# Altium footprint library Kapitoshka.PcbLib: 146 footprints (part 5 of 10)
Each footprint in its own frame and in the unit in brackets; x right, y up, seen from the top. Pads: shape width x height; smd on the part's side, far side on the other; paste and mask are expansions set on the pad; w line width, h text height; cw(c..) or ccw(c..) is an arc to the next point about the centre after c.
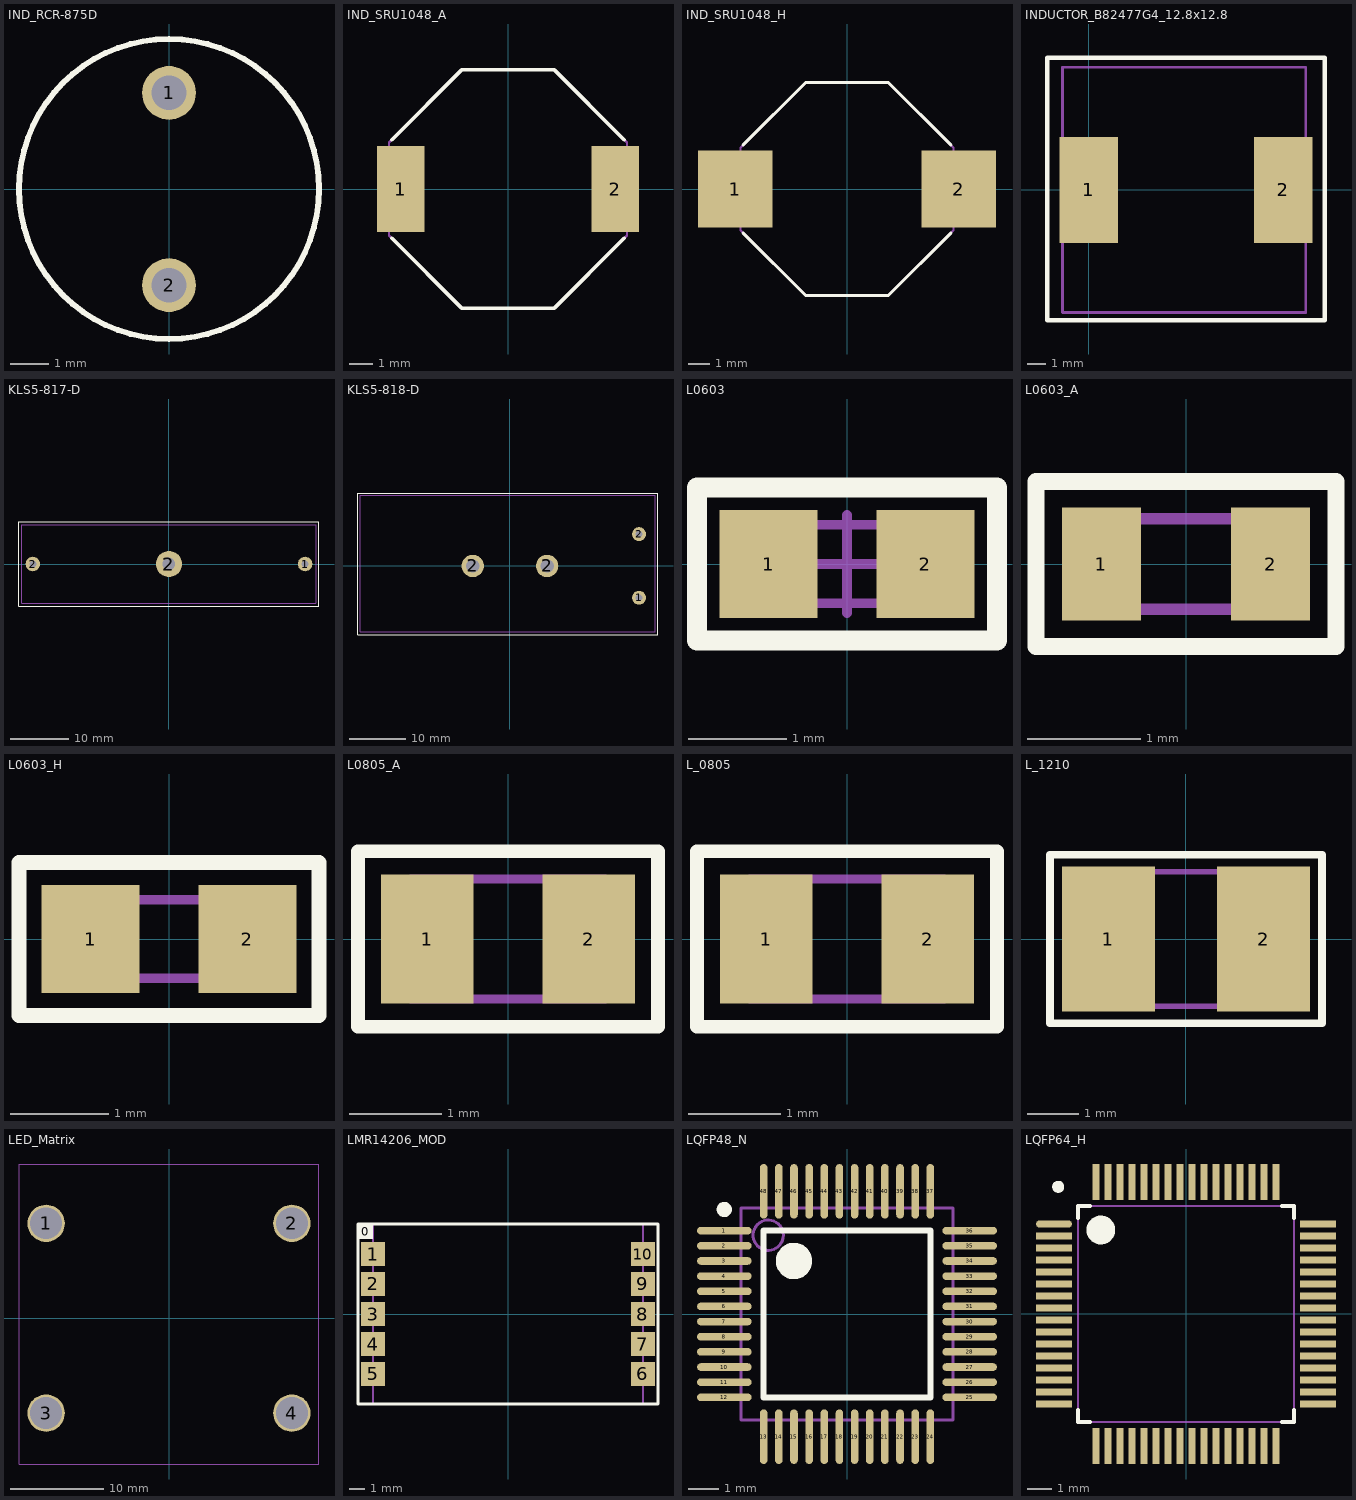
[diagram p4: the footprints below, top view; thin cyan lines are the x and y axes]

## IND_RCR-875D [mm]
height 7.5
pads (2):
  round 1.4 hole 0.9: 1(0,2.5) 2(0,-2.5)
Top Overlay:
  circle w0.15: c0,0 r3.9
Mechanical 7:
  circle w0.1: c0,0 r3.9
Mechanical 10:
  text ".Comment" at -1.245,4.335 h0.6
  text ".Designator" at -1.255,4.905 h0.8
3D body: height 7.5, standoff 0, extent -3.869,-3.892 3.9,3.892

## IND_SRU1048_A [mm]
height 5.1
pads (2):
  rect 2x3.6 smd: 1(-4.5,0) 2(4.5,0)
Top Overlay:
  lines w0.15: -4.875,-2.075 -1.95,-5 1.95,-5 4.875,-2.075 ; -4.875,2.075 -1.95,5 1.95,5 4.875,2.075
Mechanical 7:
  lines w0.1: -5,-1.95 -5,1.95 -1.95,5 1.95,5 5,1.95 5,-1.95 1.95,-5 -1.95,-5 -5,-1.95
Mechanical 10:
  text ".Comment" at -1.235,5.625 h0.6
  text ".Designator" at -1.235,6.315 h0.8
3D body: height 5.1, standoff 0, extent -5,-5 5,5

## IND_SRU1048_H [mm]
height 5.1
pads (2):
  rect 3.5x3.6 smd: 1(-5.25,0) 2(5.25,0)
Top Overlay:
  lines w0.15: -4.875,-2.075 -1.95,-5 1.95,-5 4.875,-2.075 ; -4.875,2.075 -1.95,5 1.95,5 4.875,2.075
Mechanical 7:
  lines w0.1: -5,-1.95 -5,1.95 -1.95,5 1.95,5 5,1.95 5,-1.95 1.95,-5 -1.95,-5 -5,-1.95
Mechanical 10:
  text ".Comment" at -1.235,5.625 h0.6
  text ".Designator" at -1.235,6.315 h0.8
3D body: height 5.1, standoff 0, extent -5,-5 5,5

## INDUCTOR_B82477G4_12.8x12.8 [mm] "Катушка индуктивности SMD"
pads (2):
  rect 3.1x5.6 smd: 1(0,0) 2(10.3,0)
Top Overlay:
  lines w0.25: -2.2,-6.9 -2.2,7 12.5,7 12.5,-6.9 -2.2,-6.9
Mechanical 7:
  lines w0.15: -1.4,-6.5 11.5,-6.5 11.5,6.5 -1.4,6.5 -1.4,-6.5
3D body "User Library-b82477g4.step": height 8, standoff 0, extent -1.3,-6.4 11.5,6.4

## KLS5-817-D [mm]
pads (3):
  round 2.5 hole 1.2: 1(23.405,0) 2(-23.405,0)
  round 4.5 hole 2.15: 2(0,0)
Top Overlay:
  lines w0.15: -25.775,-7.25 -25.775,7.25 25.8,7.25 25.8,-7.25 -25.775,-7.25
Mechanical 7:
  lines w0.1: 25.275,-6.75 -25.3,-6.75 -25.3,6.75 25.275,6.75 ; 25.3,-6.75 25.3,6.75
3D body "Assemblage1.STEP": height 10.86, standoff -0.14, extent -27.374,-6.25 27.374,6.25

## KLS5-818-D [mm]
pads (4):
  round 2.5 hole 1.25: 1(23.11,-5.69) 2(23.11,5.69)
  round 4 hole 2.4: 2(-6.65,0) 2(6.65,0)
Top Overlay:
  lines w0.15: -27.2,-12.3 -27.2,13 26.5,13 26.5,-12.3 -27.2,-12.3
Mechanical 7:
  lines w0.1: -26.8,-11.8 26,-11.8 26,12.7 -26.8,12.7 -26.8,-11.8
3D body "User Library-koszyk 2xAAA_214.STEP": height 13.03, standoff 0.03, extent -26.795,-11.811 26.008,12.689

## L0603 [mm]
height 0.8
pads (2):
  rect 1x1.1 smd: 1(-0.8,0) 2(0.8,0)
Top Overlay:
  lines w0.2: -1.53,-0.78 1.53,-0.78 1.53,0.78 -1.53,0.78 -1.53,-0.78
Mechanical 9:
  text ".Comment" at -1,-0.5 h0.8
  text ".Designator" at -1,0.25 h1
Mechanical 11:
  lines w0.1: -0.8,-0.4 0.8,-0.4 0.8,0.4 -0.8,0.4 -0.8,-0.4
Mechanical 15:
  lines w0.05: -1.53,-0.78 -1.53,0.78 1.53,0.78 1.53,-0.78 -1.53,-0.78
  lines w0.1: -0.5,0 0.5,0 ; 0,-0.5 0,0.5
3D body: height 0.8, standoff 0, extent -0.8,-0.4 0.8,0.4

## L0603_A [mm]
height 0.8
pads (2):
  rect 0.7x1 smd: 1(-0.75,0) 2(0.75,0)
Top Overlay:
  lines w0.15: -1.33,-0.73 1.33,-0.73 1.33,0.73 -1.33,0.73 -1.33,-0.73
Mechanical 7:
  lines w0.1: -0.8,-0.4 -0.8,0.4 0.8,0.4 0.8,-0.4 -0.8,-0.4
Mechanical 10:
  text ".Designator" at -0.62,1 h0.8
  text ".Comment" at -0.75,-1.28 h0.6
3D body: height 0.8, standoff 0, extent -0.8,-0.4 0.8,0.4

## L0603_H [mm]
height 0.8
pads (2):
  rect 1x1.1 smd: 1(-0.8,0) 2(0.8,0)
Top Overlay:
  lines w0.15: -1.53,-0.78 1.53,-0.78 1.53,0.78 -1.53,0.78 -1.53,-0.78
Mechanical 7:
  lines w0.1: -0.8,-0.4 -0.8,0.4 0.8,0.4 0.8,-0.4 -0.8,-0.4
Mechanical 10:
  text ".Comment" at -0.61,-1.33 h0.6
  text ".Designator" at -0.62,1 h0.8
3D body: height 0.8, standoff 0, extent -0.8,-0.4 0.8,0.4

## L0805_A [mm]
height 1.4
pads (2):
  rect 1x1.4 smd: 1(-0.875,0) 2(0.875,0)
Top Overlay:
  lines w0.15: -1.625,-0.95 1.625,-0.95 1.625,0.95 -1.625,0.95 -1.625,-0.95
Mechanical 7:
  lines w0.1: -1.05,-0.65 1.05,-0.65 1.05,0.65 -1.05,0.65 -1.05,-0.65
Mechanical 10:
  text ".Comment" at -1.125,-1.625 h0.6
  text ".Designator" at -1.525,1.375 h0.8
3D body: height 1.4, standoff 0, extent -1.05,-0.65 1.05,0.65

## L_0805 [mm] "SMD LED LAMP"
height 1.4
pads (2):
  rect 1x1.4 smd: 1(-0.875,0) 2(0.875,0)
Top Overlay:
  lines w0.15: -1.625,-0.95 1.625,-0.95 1.625,0.95 -1.625,0.95 -1.625,-0.95
Mechanical 7:
  lines w0.1: -1.05,-0.65 1.05,-0.65 1.05,0.65 -1.05,0.65 -1.05,-0.65
Mechanical 10:
  text ".Comment" at -1.125,-1.625 h0.6
  text ".Designator" at -1.525,1.375 h0.8
3D body "Led_Red_0805.STEP": height 1.1, standoff 0, extent -1.01,-0.625 1.01,0.625

## L_1210 [mm]
height 0.55
pads (2):
  rect 1.8x2.8 smd: 1(-1.5,0) 2(1.5,0)
Top Overlay:
  lines w0.15: -2.63,-1.63 -2.63,1.63 2.63,1.63 2.63,-1.63 -2.63,-1.63
Mechanical 7:
  lines w0.1: -1.6,-1.3 -1.6,1.3 1.6,1.3 1.6,-1.3 -1.6,-1.3
Mechanical 10:
  text ".Comment" at -0.81,-2.25 h0.6
  text ".Designator" at -0.71,1.89 h0.8
3D body: height 0.55, standoff 0, extent -1.55,-1.3 1.55,1.3

## LED_Matrix [mm] "Светодиодная матрица 8х8 32х32"
pads (4):
  round 4 hole 3.4: 1(-13.15,10.15) 2(13.15,10.15) 3(-13.15,-10.15) 4(13.15,-10.15)
Mechanical 11:
  lines w0.1: -16,-15.6 -16,16.5 16,16.5 16,-15.6 -16,-15.6
3D body "dotmatrixModule.STEP": height 23.7, standoff -5, extent -16.05,-15.6 16.05,16.5

## LMR14206_MOD [mm]
height 5
pads (11):
  rect 1x1 on Top Overlay: 0(-9.5,5.5)
  rect 1.6x1.6 smd: 1(-9,4) 2(-9,2) 3(-9,0) 4(-9,-2) 5(-9,-4) 6(9,-4) 7(9,-2) 8(9,0) 9(9,2) 10(9,4)
Top Overlay:
  lines w0.2: -10,-6 -10,6 10,6 10,-6 -10,-6
Mechanical 9:
  text ".Designator" at -2.05,1.5 h0.8
  text ".Comment" at -2.35,2.3 h0.8
Mechanical 11:
  lines w0.15: -9,-6 9,-6 9,6 -9,6 -9,-6
3D body "KPTV.E11.013.98.00.step": height 3.5, standoff 0.09, extent -9,-6 9,6

## LQFP48_N [mm] "Thin QFP, 48-Leads, Body 7x7mm, Pitch 0.5mm, IPC Medium Density"
height 1.6
pads (48):
  oval 1.8x0.25 smd: 1(-4.05,2.75) 2(-4.05,2.25) 3(-4.05,1.75) 4(-4.05,1.25) 5(-4.05,0.75) 6(-4.05,0.25) 7(-4.05,-0.25) 8(-4.05,-0.75) 9(-4.05,-1.25) 10(-4.05,-1.75) 11(-4.05,-2.25) 12(-4.05,-2.75) 25(4.05,-2.75) 26(4.05,-2.25) 27(4.05,-1.75) 28(4.05,-1.25) 29(4.05,-0.75) 30(4.05,-0.25) 31(4.05,0.25) 32(4.05,0.75) 33(4.05,1.25) 34(4.05,1.75) 35(4.05,2.25) 36(4.05,2.75)
  oval 0.25x1.8 smd: 13(-2.75,-4.05) 14(-2.25,-4.05) 15(-1.75,-4.05) 16(-1.25,-4.05) 17(-0.75,-4.05) 18(-0.25,-4.05) 19(0.25,-4.05) 20(0.75,-4.05) 21(1.25,-4.05) 22(1.75,-4.05) 23(2.25,-4.05) 24(2.75,-4.05) 37(2.75,4.05) 38(2.25,4.05) 39(1.75,4.05) 40(1.25,4.05) 41(0.75,4.05) 42(0.25,4.05) 43(-0.25,4.05) 44(-0.75,4.05) 45(-1.25,4.05) 46(-1.75,4.05) 47(-2.25,4.05) 48(-2.75,4.05)
Top Overlay:
  circle w0.6: c-1.75,1.75 r0.3
  circle w0.25: c-4.05,3.45 r0.125
  lines w0.2: -2.75,-2.75 2.75,-2.75 2.75,2.75 -2.75,2.75 -2.75,-2.75
Mechanical 7:
  circle w0.1: c-2.6,2.6 r0.5
  lines w0.1: -3.5,-3.5 3.5,-3.5 3.5,3.5 -3.5,3.5 -3.5,-3.5
Mechanical 10:
  text ".Designator" at 1.9,5.4 h0.8
  text ".Comment" at -3.7,-5.6 h0.6
3D body "vbh48a.stp": height 1.46, standoff -0.04, extent -4.507,-4.507 4.508,4.508

## LQFP64_H [mm] "64-Pin Low Profile Quad Pack 0.5 mm Pitch, IPC High Density"
height 1.6
pads (64):
  oval 1.5x0.3 smd mask+0.05: 1(-5.5,3.75)
  rect 1.5x0.3 smd mask+0.05: 2(-5.5,3.25) 3(-5.5,2.75) 4(-5.5,2.25) 5(-5.5,1.75) 6(-5.5,1.25) 7(-5.5,0.75) 8(-5.5,0.25) 9(-5.5,-0.25) 10(-5.5,-0.75) 11(-5.5,-1.25) 12(-5.5,-1.75) 13(-5.5,-2.25) 14(-5.5,-2.75) 15(-5.5,-3.25) 16(-5.5,-3.75) 33(5.5,-3.75) 34(5.5,-3.25) 35(5.5,-2.75) 36(5.5,-2.25) 37(5.5,-1.75) 38(5.5,-1.25) 39(5.5,-0.75) 40(5.5,-0.25) 41(5.5,0.25) 42(5.5,0.75) 43(5.5,1.25) 44(5.5,1.75) 45(5.5,2.25) 46(5.5,2.75) 47(5.5,3.25) 48(5.5,3.75)
  rect 0.3x1.5 smd mask+0.05: 17(-3.75,-5.5) 18(-3.25,-5.5) 19(-2.75,-5.5) 20(-2.25,-5.5) 21(-1.75,-5.5) 22(-1.25,-5.5) 23(-0.75,-5.5) 24(-0.25,-5.5) 25(0.25,-5.5) 26(0.75,-5.5) 27(1.25,-5.5) 28(1.75,-5.5) 29(2.25,-5.5) 30(2.75,-5.5) 31(3.25,-5.5) 32(3.75,-5.5) 49(3.75,5.5) 50(3.25,5.5) 51(2.75,5.5) 52(2.25,5.5) 53(1.75,5.5) 54(1.25,5.5) 55(0.75,5.5) 56(0.25,5.5) 57(-0.25,5.5) 58(-0.75,5.5) 59(-1.25,5.5) 60(-1.75,5.5) 61(-2.25,5.5) 62(-2.75,5.5) 63(-3.25,5.5) 64(-3.75,5.5)
Top Overlay:
  circle w0.25: c-5.325,5.3 r0.125
  circle w0.6: c-3.55,3.5 r0.3
  lines w0.15: -4.5,-4 -4.5,-4.5 -4,-4.5 ; -4.5,4 -4.5,4.5 -4,4.5 ; 4,-4.5 4.5,-4.5 4.5,-4 ; 4,4.5 4.5,4.5 4.5,4
Mechanical 7:
  lines w0.1: -4.5,-4.5 -4.5,4.5 4.5,4.5 4.5,-4.5 -4.5,-4.5
3D body "User Library-lqpf64.step": height 1.5, standoff 0.02, extent -6,-6 6,6